# Altium footprint library AMAP4BPXEVBv2.PcbLib: 58 footprints (part 3 of 4)
Each footprint in its own frame and in the unit in brackets; x right, y up, seen from the top. Pads: shape width x height; smd on the part's side, far side on the other; paste and mask are expansions set on the pad; w line width, h text height; cw(c..) or ccw(c..) is an arc to the next point about the centre after c.
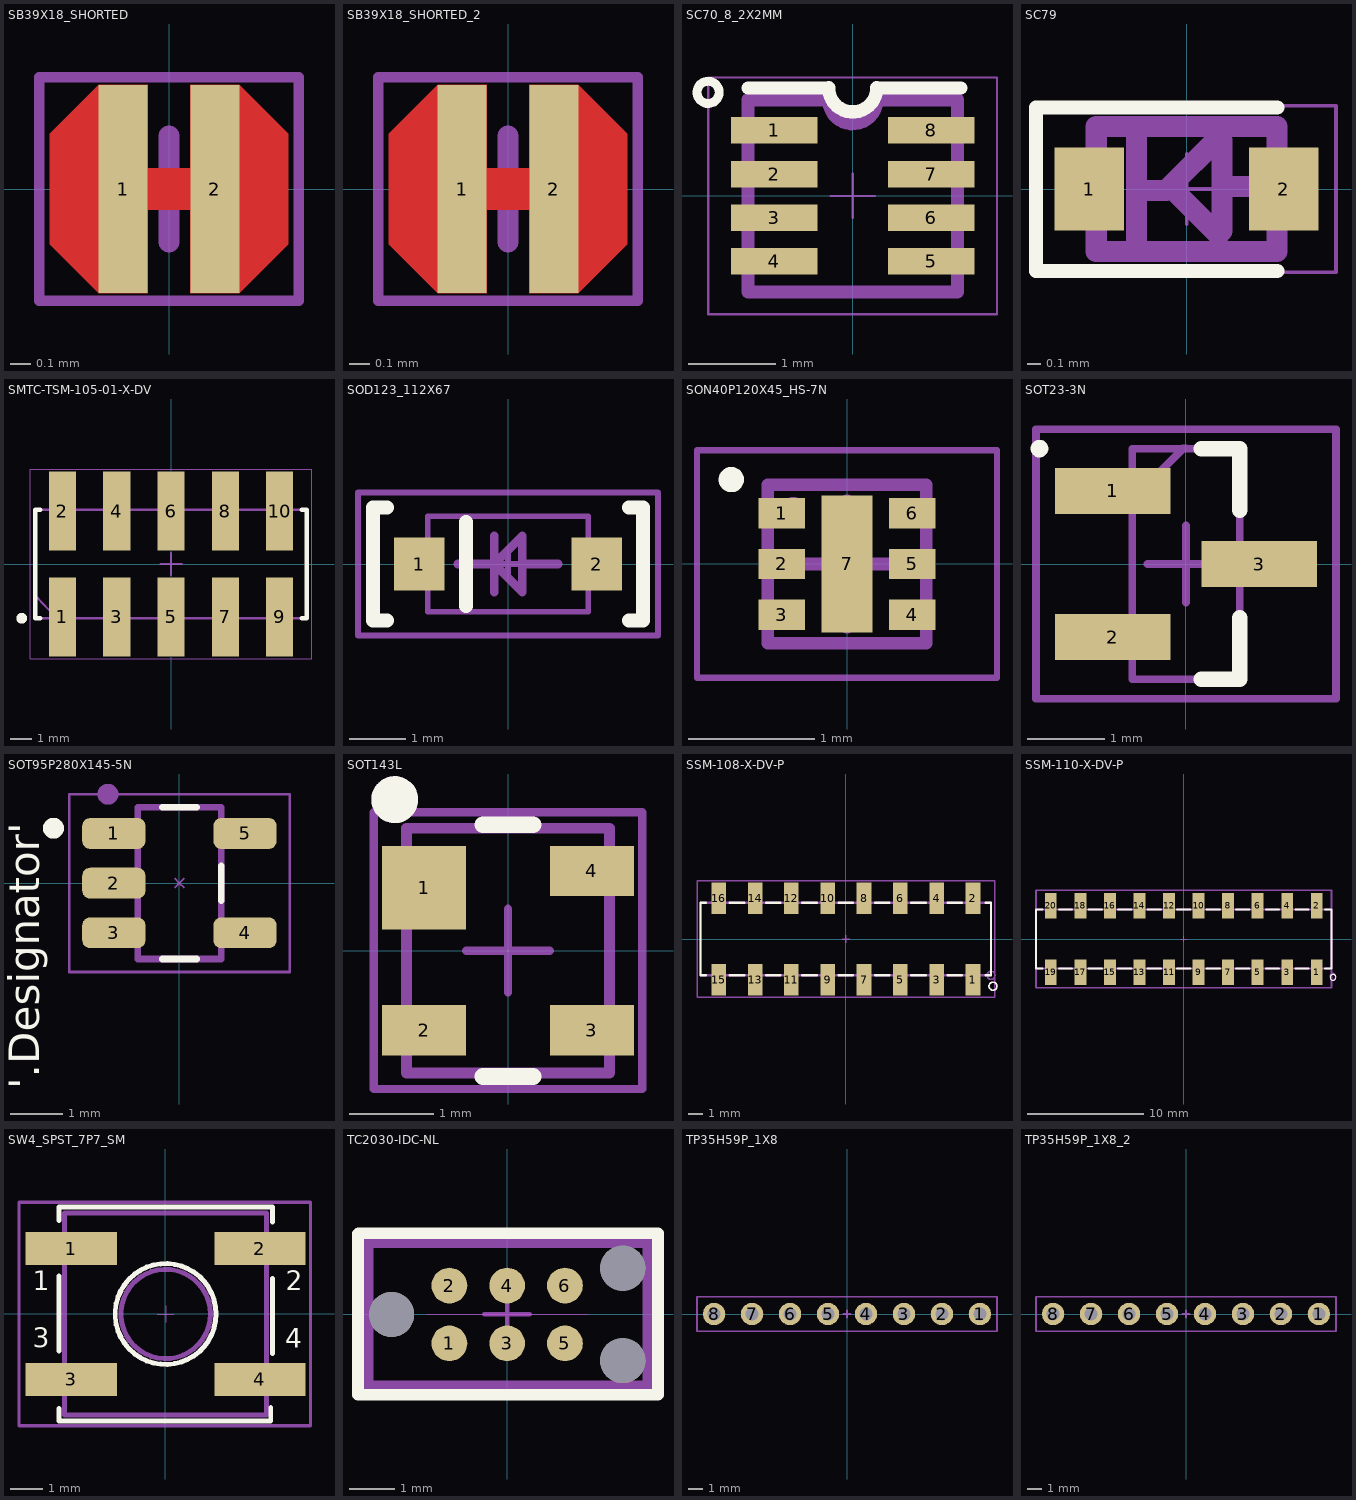
[diagram p2: the footprints below, top view; thin cyan lines are the x and y axes]

## SB39X18_SHORTED [mm] "SB39X18_SHORTED"
pads (2):
  rect 0.236x1 smd paste+0 mask+0.102: 1(-0.22,0) 2(0.22,0)
Top Layer:
  rectangle: -0.481,-0.101 0.481,0.102
  region: -0.572,-0.264 -0.572,0.264 -0.338,0.5 -0.102,0.5 -0.102,-0.5 -0.338,-0.5
  region: -0.572,-0.264 -0.572,0.264 -0.338,0.5 -0.102,0.5 -0.102,-0.5 -0.338,-0.5
  region: 0.572,0.264 0.572,-0.264 0.338,-0.5 0.102,-0.5 0.102,0.5 0.338,0.5
  region: 0.572,0.264 0.572,-0.264 0.338,-0.5 0.102,-0.5 0.102,0.5 0.338,0.5
Top Overlay:
  text ".Designator" at 0.574,-0.714 h1.02
Top Solder:
  region: -0.622,0.279 -0.622,-0.279 -0.366,-0.536 0,-0.536 0,0.536 -0.366,0.536
  region: -0.622,0.279 -0.622,-0.279 -0.366,-0.536 0,-0.536 0,0.536 -0.366,0.536
  region: 0.622,-0.279 0.622,0.279 0.366,0.536 0,0.536 0,-0.536 0.366,-0.536
  region: 0.622,-0.279 0.622,0.279 0.366,0.536 0,0.536 0,-0.536 0.366,-0.536
Top Assembly:
  lines w0.051: -0.622,-0.536 0.622,-0.536 0.622,0.536 -0.622,0.536 -0.622,-0.536
  text "No Assembly Req'd" at -0.622,-0.536 h0.2
  text ".Designator" at 0.828,-0.841 h1.02
  text "Solderbridge" at -0.508,0.292 h0.2
Top Courtyard:
  lines w0.025: -0.622,-0.536 0.622,-0.536 0.622,0.536 -0.622,0.536 -0.622,-0.536
Top Component Center:
  lines w0.102: -0.254,0 0.254,0 ; 0,-0.254 0,0.254

## SB39X18_SHORTED_2 [mm]
pads (2):
  rect 0.236x1 smd paste+0 mask+0.102: 1(-0.22,0) 2(0.22,0)
Top Layer:
  rectangle: -0.481,-0.101 0.481,0.102
  region: -0.572,-0.264 -0.572,0.264 -0.338,0.5 -0.102,0.5 -0.102,-0.5 -0.338,-0.5
  region: -0.572,-0.264 -0.572,0.264 -0.338,0.5 -0.102,0.5 -0.102,-0.5 -0.338,-0.5
  region: 0.572,0.264 0.572,-0.264 0.338,-0.5 0.102,-0.5 0.102,0.5 0.338,0.5
  region: 0.572,0.264 0.572,-0.264 0.338,-0.5 0.102,-0.5 0.102,0.5 0.338,0.5
Top Overlay:
  text ".Designator" at -1.118,0.762 h1.02
Top Solder:
  region: -0.622,0.279 -0.622,-0.279 -0.366,-0.536 0,-0.536 0,0.536 -0.366,0.536
  region: -0.622,0.279 -0.622,-0.279 -0.366,-0.536 0,-0.536 0,0.536 -0.366,0.536
  region: 0.622,-0.279 0.622,0.279 0.366,0.536 0,0.536 0,-0.536 0.366,-0.536
  region: 0.622,-0.279 0.622,0.279 0.366,0.536 0,0.536 0,-0.536 0.366,-0.536
Top Assembly:
  lines w0.051: -0.622,-0.536 -0.622,0.536 0.622,0.536 0.622,-0.536 -0.622,-0.536
  text ".Designator" at 0.968,-0.311 h1.02
  text "Solderbridge" at -0.508,0.292 h0.2
  text "No Assembly Req'd" at -0.622,-0.536 h0.2
Top Courtyard:
  lines w0.025: -0.622,-0.536 0.622,-0.536 0.622,0.536 -0.622,0.536 -0.622,-0.536
Top Component Center:
  lines w0.102: -0.254,0 0.254,0 ; 0,-0.254 0,0.254

## SC70_8_2X2MM [mil] "SC70_8_2X2MM"
pads (8):
  rect 39x12 smd mask+1.97: 1(-35.35,29.5) 2(-35.35,9.8) 3(-35.35,-9.8) 4(-35.35,-29.5) 5(35.45,-29.5) 6(35.45,-9.8) 7(35.45,9.8) 8(35.45,29.5)
Top Overlay:
  circle w4: c-65.11,46.64 r5
  lines w6: -47.15,48.6 -11.35,48.6 ; -10.8,48.65 ccw(c0.05,48.65) 10.9,48.65 ; 11.4,48.62 48.7,48.62
  text ".Designator" at -93.03,59.65 h40
Top Assembly:
  lines w6: -11.35,43.3 -47.15,43.3 -47.15,-43.3 47.25,-43.3 47.25,43.3 10.05,43.3 ; -10.65,45 ccw(c0.06,43.32) -9.55,38.3 ccw(c0.05,43.38) 10.66,45.7
  text ".Designator" at -90.13,7.51 h40
  text "1" at -79.05,29.8 h25
Top Courtyard:
  lines w1: -65.05,-53.3 -65.05,53.3 65.05,53.3 65.05,-53.3 -65.05,-53.3
Top Component Center:
  lines w1: -9.95,0 10.05,0 ; 0.05,-10 0.05,10
3D body: height 150, standoff 0, extent -55.05,-43.3 55.05,43.3

## SC79 [mm] "SC79"
pads (2):
  rect 0.5x0.6 smd paste-0.05 mask+0.05: 1(-0.7,0) 2(0.7,0)
Top Overlay:
  lines w0.102: 0.652,-0.591 -1.085,-0.591 -1.085,0.588 0.652,0.588
  text ".Designator" at -0.701,0.712 h1.02
Top Assembly:
  lines w0.152: -0.361,-0.442 -0.361,0.381 ; -0.348,-0.01 -0.147,-0.01 -0.119,0.018 ; 0.254,0.018 0.577,0.018 ; -0.119,0.018 0.229,-0.33 0.254,-0.302 0.254,0.351 0.213,0.351 -0.119,0.018 ; -0.65,-0.45 0.65,-0.45 0.65,0.45 -0.65,0.45 -0.65,-0.45
  text ".Designator" at -0.639,0.703 h1.02
Top Courtyard:
  lines w0.025: -1.075,-0.6 -1.075,0.6 1.075,0.6 1.075,-0.6 -1.075,-0.6
Top Component Center:
  lines w0.025: -0.254,0 0.254,0 ; 0,-0.254 0,0.254

## SMTC-TSM-105-01-X-DV [mm] "Double Row Gullwing ASM, 2x5 Pins, Vertical, 2.54mm Pitch, Male"
height 9.9
pads (10):
  rect 1.27x3.68 smd: 1(-5.08,-2.475) 2(-5.08,2.475) 3(-2.54,-2.475) 4(-2.54,2.475) 5(0,-2.475) 6(0,2.475) 7(2.54,-2.475) 8(2.54,2.475) 9(5.08,-2.475) 10(5.08,2.475)
Top Overlay:
  circle w0.25: c-6.985,-2.54 r0.125
  lines w0.2: -6.115,-2.54 -6.35,-2.54 -6.35,2.54 -6.115,2.54 ; 6.115,-2.54 6.35,-2.54 6.35,2.54 6.115,2.54
  text ".Designator" at 3.783,-0.5 h1.52
Top Assembly:
  lines w0.1: -6.35,-2.54 6.35,-2.54 6.35,2.54 -6.35,2.54 -6.35,-2.54
  lines w0.102: -6.35,-1.475 -5.346,-2.54
  text ".Designator" at -2.289,-0.23 h1.02
Top Courtyard:
  lines w0.05: -6.575,-4.44 -6.575,4.44 6.575,4.44 6.575,-4.44 -6.575,-4.44
Top Component Center:
  lines w0.1: -0.5,0 0.5,0 ; 0,-0.5 0,0.5
3D body "TSM-105-01-X-DV.step": height 9.65, standoff 0, extent -6.35,-3.683 6.35,3.683

## SOD123_112X67 [mil] "SOD123_112X67"
pads (2):
  rect 35.4x37.4 smd: 1(-62,0) 2(62,0)
Top Overlay:
  lines w9.8: -84.6,-39.4 -94.5,-39.4 -94.5,39.4 -84.6,39.4 ; -29.5,-29.5 -29.5,29.5 ; 84.6,-39.4 94.5,-39.4 94.5,39.4 84.6,39.4
  text ".Designator" at -80,52 h40
Top Assembly:
  lines w4: -56.1,-33.5 -56.1,33.5 56.1,33.5 56.1,-33.5 -56.1,-33.5
  lines w6: -35,0 -9.6,0 ; -9.6,-19.7 -9.6,19.7 ; 10,0 35,0 ; -9.6,0 10,-19.7 10,19.7 -9.6,0
  text ".Designator" at -1,40 h40
Top Courtyard:
  lines w4: -105,-50 -105,50 105,50 105,-50 -105,-50
Top Component Center:
  lines w4: -10,0 10,0 ; 0,-10 0,10
3D body "SOD-323.STEP": height 39.37, standoff 1.73, extent -51.62,-26.34 52.63,24.84

## SON40P120X45_HS-7N [mm] "SON, 6-Leads, Body 1.20x1.20mm, Pitch 0.40mm, Thermal Pad 2.40x0.79mm, IPC Medium Density"
height 0.45
pads (7):
  rect 0.37x0.24 smd paste+0 mask+0.03: 1(-0.515,0.4) 2(-0.515,0) 3(-0.515,-0.4) 4(0.515,-0.4) 5(0.515,0) 6(0.515,0.4)
  rect 0.4x1.08 smd paste+0 mask+0.03: 7(0,0)
Top Overlay:
  circle w0.1: c-0.914,0.667 r0.05
  text ".Designator" at -2.252,0.861 h1
Top Assembly:
  circle w0.152: c-0.426,0.444 r0.009
  lines w0.1: -0.625,-0.625 0.625,-0.625 0.625,0.625 -0.625,0.625 -0.625,-0.625
  text ".Designator" at -2.261,-0.275 h1
Top Courtyard:
  lines w0.05: -1.185,-0.9 -1.185,0.9 1.185,0.9 1.185,-0.9 -1.185,-0.9
  lines w0.051: -1.185,-0.9 -1.185,0.9 1.185,0.9 1.185,-0.9 -1.185,-0.9
Top Component Center:
  lines w0.1: -0.5,0 0.5,0 ; 0,-0.5 0,0.5
3D body "SON40P120X45_HS-7N.step": height 0.45, standoff 0, extent -0.626,-0.625 0.626,0.625

## SOT23-3N [mm] "SOT23, 3-Leads, Body 2.9x1.3mm, Pitch 0.95mm, Lead Span 2.5mm, IPC Medium Density"
height 1.1
pads (3):
  rect 1.5x0.6 smd: 1(-0.95,0.95) 2(-0.95,-0.95) 3(0.95,0)
Top Overlay:
  circle w0.152: c-1.905,1.5 r0.038
  lines w0.2: 0.2,-1.5 0.7,-1.5 0.7,-0.7 ; 0.2,1.5 0.7,1.5 0.7,0.7
Top Assembly:
  lines w0.1: -0.7,-1.5 0.7,-1.5 0.7,1.5 -0.7,1.5 -0.7,-1.5
  lines w0.102: -0.692,0.847 -0.039,1.5 0,1.5
  text ".Designator" at -2.289,-0.23 h1.02
Top Courtyard:
  lines w0.1: -1.95,-1.75 -1.95,1.75 1.95,1.75 1.95,-1.75 -1.95,-1.75
Top Component Center:
  lines w0.1: -0.5,0 0.5,0 ; 0,-0.5 0,0.5
3D body "SOT23.STEP": height 1.08, standoff 0, extent -1.345,-1.5 1.295,1.5

## SOT95P280X145-5N [mm]
pads (5):
  rrect50% 1.21x0.59 smd: 1(-1.255,0.95) 2(-1.255,0) 3(-1.255,-0.95) 4(1.255,-0.95) 5(1.255,0.95)
Top Overlay:
  circle w0.2: c-2.41,1.05 r0.1
  lines w0.127: -0.33,-1.45 0.33,-1.45 ; -0.33,1.45 0.33,1.45 ; 0.8,-0.335 0.8,0.335
  text "'.Designator'" at -2.494,-3.937 h1
Top Assembly:
  lines w0.127: -0.8,-1.45 0.8,-1.45 0.8,1.45 -0.8,1.45 -0.8,-1.45
  lines w0.2: -1.267,1.7 cw(c-1.367,1.7) -1.267,1.703
  text "'.Designator'" at 0.156,-0.6 h1
Top Courtyard:
  lines w0.05: -2.11,-1.7 -2.11,1.7 2.11,1.7 2.11,-1.7 -2.11,-1.7
Top Component Center:
  lines w0.025: -0.09,-0.09 0,0 ; -0.09,0.09 0,0 ; 0.09,-0.09 0,0 ; 0.09,0.09 0,0

## SOT143L [mm]
pads (4):
  rect 1x1 smd: 1(-1,0.75)
  rect 1x0.6 smd: 2(-1,-0.95) 3(1,-0.95) 4(1,0.95)
Top Overlay:
  circle w0.305: c-1.35,1.8 r0.127
  lines w0.2: -0.3,-1.5 0.3,-1.5 ; -0.3,1.5 0.3,1.5
  text ".Designator" at -2.364,2.108 h1
Top Assembly:
  circle w0.305: c-1.35,1.8 r0.127
  lines w0.127: -1.21,-1.46 1.21,-1.46 1.21,1.46 -1.21,1.46 -1.21,-1.46
  lines w0.2: -0.3,-1.5 0.3,-1.5 ; -0.3,1.5 0.3,1.5
  text ".Designator" at -0.319,3.459 h1.52
Top 3D Body:
  lines w0.127: -1.21,-1.46 1.21,-1.46 1.21,1.46 -1.21,1.46 -1.21,-1.46
Top Courtyard:
  lines w0.1: -1.6,-1.65 1.6,-1.65 1.6,1.65 -1.6,1.65 -1.6,-1.65
Top Component Center:
  lines w0.1: -0.5,0 0.5,0 ; 0,-0.5 0,0.5
3D body "User Library-sot143.STEP": height 1, standoff 0, extent -1.21,-1.46 1.21,1.46

## SSM-108-X-DV-P [mil] "SSM-108-X-DV-P"
pads (16):
  rect 40.2x87.4 smd: 1(350,-112.5) 2(350,112.5) 3(250,-112.5) 4(250,112.5) 5(150,-112.5) 6(150,112.5) 7(50,-112.5) 8(50,112.5) 9(-50,-112.5) 10(-50,112.5) 11(-150,-112.5) 12(-150,112.5) 13(-250,-112.5) 14(-250,112.5) 15(-350,-112.5) 16(-350,112.5)
Top Overlay:
  circle w4: c405,-130 r11.18
  lines w6: -385,-100 -400,-100 -400,100 -385,100 ; -320,-100 -280,-100 ; -320,100 -280,100 ; -220,-100 -180,-100 ; -220,100 -180,100 ; -120,-100 -80,-100 ; -120,100 -80,100 ; -20,-100 20,-100 ; -20,100 20,100 ; 80,-100 120,-100 ; 80,100 120,100 ; 180,-100 220,-100 ; 180,100 220,100 ; 280,-100 320,-100 ; 280,100 320,100 ; 385,-100 400,-100 400,100 385,100
  text ".Designator" at -418.1,-47.2 h80
Top Assembly:
  circle w4: c400,-100 r11.18
  lines w6: -400,-100 -400,100 400,100 400,-100 -400,-100
  text ".Designator" at -90.13,7.51 h40
Top Courtyard:
  lines w4: -410,-160 410,-160 410,160 -410,160 -410,-160
Top Component Center:
  lines w4: -10,0 10,0 ; 0,-10 0,10
3D body "SSM-108-L-DV-P-TR.stp": height 338, standoff -4, extent -400,-138.5 400,138.5

## SSM-110-X-DV-P [mil] "SSM-110-X-DV-P"
pads (20):
  rect 40.2x87.4 smd: 1(450,-112.5) 2(450,112.5) 3(350,-112.5) 4(350,112.5) 5(250,-112.5) 6(250,112.5) 7(150,-112.5) 8(150,112.5) 9(50,-112.5) 10(50,112.5) 11(-50,-112.5) 12(-50,112.5) 13(-150,-112.5) 14(-150,112.5) 15(-250,-112.5) 16(-250,112.5) 17(-350,-112.5) 18(-350,112.5) 19(-450,-112.5) 20(-450,112.5)
Top Overlay:
  circle w4: c505,-130 r10
  lines w6: -477.05,-100 -500,-100 -500,100 -477.05,100 ; -422.95,-100 -377.05,-100 ; -422.95,100 -377.05,100 ; -322.95,-100 -277.05,-100 ; -322.95,100 -277.05,100 ; -222.95,-100 -177.05,-100 ; -222.95,100 -177.05,100 ; -122.95,-100 -77.05,-100 ; -122.95,100 -77.05,100 ; -22.95,-100 22.95,-100 ; -22.95,100 22.95,100 ; 77.05,-100 122.95,-100 ; 77.05,100 122.95,100 ; 177.05,-100 222.95,-100 ; 177.05,100 222.95,100 ; 277.05,-100 322.95,-100 ; 277.05,100 322.95,100 ; 377.05,-100 422.95,-100 ; 377.05,100 422.95,100 ; 477.05,-100 500,-100 500,100 477.05,100
  text ".Designator" at -500,117 h80
Top Assembly:
  circle w4: c504.32,-126.26 r10
  lines w6: -500,-100 500,-100 500,100 -500,100 -500,-100
  text ".Designator" at -90.13,7.51 h40
Top Courtyard:
  lines w6: -500,-165 -500,165 500,165 500,-165 -500,-165
Top Component Center:
  lines w4: -10,0 10,0 ; 0,-10 0,10
3D body "SSM-110-L-DV-P.stp": height 338, standoff -4, extent -500,-138.5 500,138.5

## SW4_SPST_7P7_SM [mil]
pads (4):
  rect 110x40 smd: 1(-113.61,78.45) 2(114.39,78.45) 3(-113.61,-79.55) 4(114.39,-79.55)
Top Overlay:
  circle w6: c0.39,-0.55 r61
  lines w6: -128.61,-114.55 -128.61,-129.55 127.39,-129.55 127.39,-113.55 ; -128.61,-45.55 -128.61,45.45 ; -128.61,112.45 -128.61,128.45 129.39,128.45 129.39,110.45 ; 129.39,-48.55 129.39,42.45
  text ".Designator" at 100,-154 h25
  text "4" at 144.94,-49.25 h40
  text "2" at 145.67,20.16 h40
  text "3" at -160.24,-48.82 h40
  text "1" at -160.24,20.16 h40
Top Assembly:
  circle w6: c0.39,-0.55 r54
  lines w6: -121.61,-122.55 122.39,-122.55 122.39,121.45 -121.61,121.45 -121.61,-122.55
  text ".Designator" at -64.61,84.45 h25
  text "3" at -166.54,-125.43 h25
  text "4" at 153.58,-124.92 h25
  text "2" at 155.63,106.61 h25
  text "1" at -166.02,107.13 h25
Top Courtyard:
  lines w4: -176.72,-135.55 175.31,-135.55 175.31,134.45 -176.72,134.45 -176.72,-135.55
Top Component Center:
  lines w1: -9.61,-0.55 10.39,-0.55 ; 0.39,-10.55 0.39,9.45
3D body "KSC441J70SHLFS.stp": height 204.53, standoff 0.04, extent -133.86,-124.02 133.86,124.02

## TC2030-IDC-NL [mil] "TC2030-IDC"
pads (9):
  round 30.98 smd paste+0 mask+1.97: 1(-50,-25)
  round 30.98 smd paste-39.37 mask+1.97: 2(-50,25) 3(0,-25) 4(0,25) 5(50,-25) 6(50,25)
  round 39.02 hole 39.02 unplated paste-39.37 mask+0: ""(-100,0) ""(100,-40) ""(100,40)
Top Layer keep-out:
  region: -69.6,0.39 70.31,0.39 70.31,-0.39 -69.6,-0.39
Top Overlay:
  lines w10: -129.09,-69.57 -129.09,69.91 -128.65,70.35 130.51,70.35 130.51,-69.57 -129.09,-69.57
  text ".Designator" at -139,-40 h60
Top Assembly:
  text ".Designator" at -135.28,-13.37 h60
Top Courtyard:
  lines w10: -120.71,-62.28 121.93,-62.28 121.93,62.72 -120.71,62.72 -120.71,-62.28
Top Component Center:
  lines w3.94: -19.76,0.2 19.61,0.2 ; -0.08,-19.49 -0.08,19.88

## TP35H59P_1X8 [mil] "TP35H59P_1X8"
pads (8):
  round 59 hole 35: 1(350,0) 2(250,0) 3(150,0) 4(50,0) 5(-50,0) 6(-150,0) 7(-250,0) 8(-350,0)
Top Assembly:
  lines w4: -395,-45 395,-45 395,45 -395,45 -395,-45
  text "1" at 410,-12.85 h40
  text ".Designator" at 94.13,3.49 h40
  text "8" at -435,-12.63 h40
Top Courtyard:
  lines w4: -395,-45 395,-45 395,45 -395,45 -395,-45
Top Component Center:
  lines w4: -10,0 10,0 ; 0,-10 0,10

## TP35H59P_1X8_2 [mil]
pads (8):
  round 59 hole 35: 1(350,0) 2(250,0) 3(150,0) 4(50,0) 5(-50,0) 6(-150,0) 7(-250,0) 8(-350,0)
Top Assembly:
  lines w4: -395,-45 395,-45 395,45 -395,45 -395,-45
  text "1" at 410,-12.85 h40
  text ".Designator" at 93.13,10.49 h40
  text "8" at -435,-12.63 h40
Top Courtyard:
  lines w4: -395,-45 395,-45 395,45 -395,45 -395,-45
Top Component Center:
  lines w4: -10,0 10,0 ; 0,-10 0,10